# Altium footprint library DCDCv1.1.PcbLib: 114 footprints (part 4 of 8)
Each footprint in its own frame and in the unit in brackets; x right, y up, seen from the top. Pads: shape width x height; smd on the part's side, far side on the other; paste and mask are expansions set on the pad; w line width, h text height; cw(c..) or ccw(c..) is an arc to the next point about the centre after c.
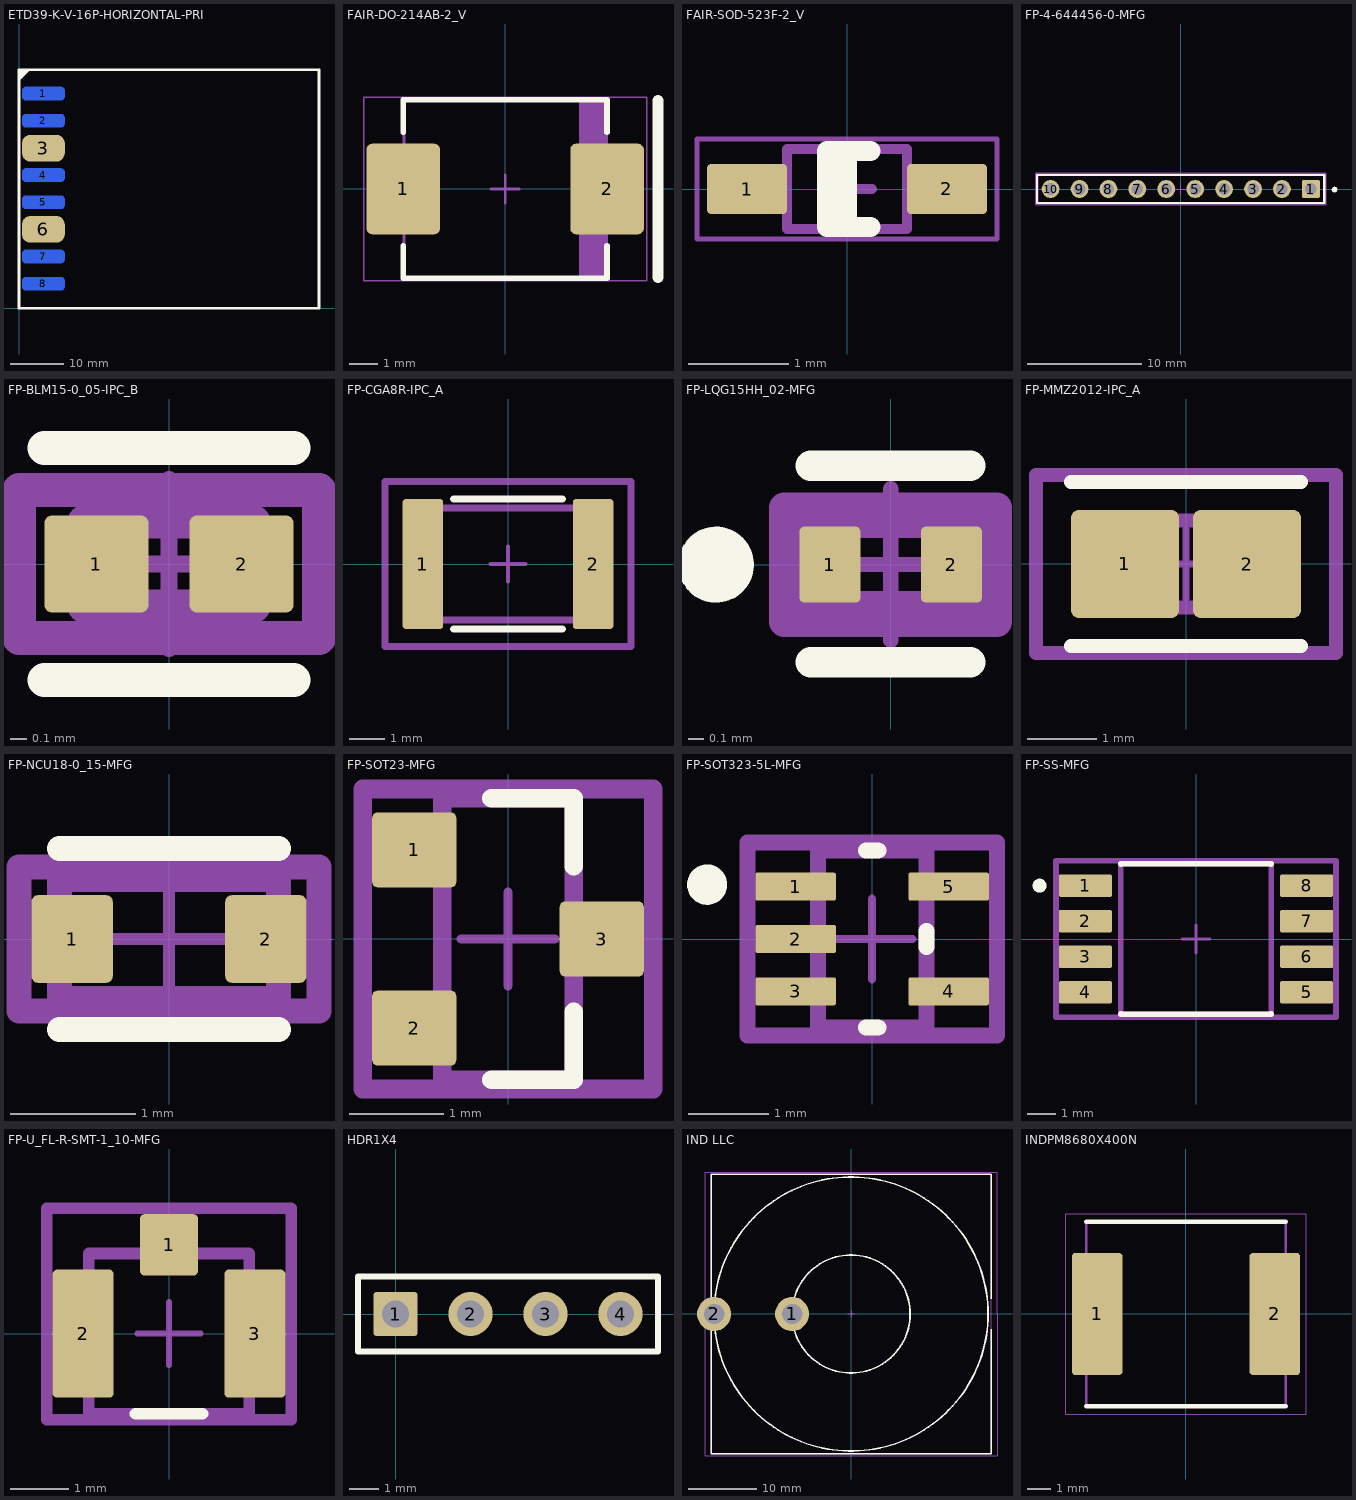
[diagram p3: the footprints below, top view; thin cyan lines are the x and y axes]

## ETD39-K-V-16P-HORIZONTAL-PRI [mm]
pads (8):
  rrect60% 8x2.5 smd far side: 1(4.564,40.132) 2(4.564,35.052) 4(4.564,24.892) 5(4.564,19.812) 7(4.564,9.652) 8(4.564,4.572)
  rrect60% 8x5 smd: 3(4.564,29.925) 6(4.564,14.732)
Top Overlay:
  region: 0.127,42.672 1.905,44.45 0.127,44.45 0,44.577
  lines w0.5: 0,0 0,44.577 56.134,44.577 56.134,0 0,0
3D body "ETD39-K-V-16P.STEP": height 0.5, standoff -28.5, extent 3.225,0.125 55.425,44.625

## FAIR-DO-214AB-2_V [mm]
pads (2):
  rrect15% 2.6x3.2 smd: 1(-3.6,0) 2(3.6,0)
Top Overlay:
  lines w0.2: -3.6,-2 -3.6,-3.15 3.6,-3.15 3.6,-2 ; -3.6,2 -3.6,3.15 3.6,3.15 3.6,2
  lines w0.4: 5.4,-3.125 5.4,3.125
Mechanical 13:
  rectangle: 2.613,-3.125 3.575,3.125
  lines w0.1: -3.575,-3.125 3.575,-3.125 3.575,3.125 -3.575,3.125 -3.575,-3.125
Mechanical 15:
  lines w0.05: -5,-3.25 5,-3.25 5,3.25 -5,3.25 -5,-3.25
  lines w0.1: -0.5,0 0.5,0 ; 0,-0.5 0,0.5
3D body "DIOM6959X26L.step": height 2.65, standoff 0, extent -3.795,-3.125 3.795,3.125

## FAIR-SOD-523F-2_V [mm]
pads (2):
  rrect15% 0.8x0.5 smd: 1(-1,0) 2(1,0)
Top Overlay:
  lines w0.2: 0,-0.381 0,0.381 ; 0.236,-0.381 -0.2,-0.381 -0.2,0.381 0.236,0.381
Mechanical 13:
  lines w0.1: -0.6,-0.4 -0.6,0.4 0.6,0.4 0.6,-0.4 -0.6,-0.4
Mechanical 15:
  lines w0.05: -1.5,-0.5 -1.5,0.5 1.5,0.5 1.5,-0.5 -1.5,-0.5
  lines w0.1: -0.25,0 0.25,0 ; 0,-0.25 0,0.25
3D body: height 0.71, standoff 0.01, extent -0.6,-0.4 0.6,0.4

## FP-4-644456-0-MFG [mil]
pads (10):
  rrect15% 61.65x61.65 hole 40 paste-39370.1 mask+0: 1(450,0)
  round 61.65 hole 40 paste-39370.1 mask+0: 2(350,0) 3(250,0) 4(150,0) 5(50,0) 6(-50,0) 7(-150,0) 8(-250,0) 9(-350,0) 10(-450,0)
Top Overlay:
  circle w9.84: c531.95,-1.97 r4.92
  lines w7.87: -496.59,-48.5 496.59,-48.5 496.59,48.5 -496.59,48.5 -496.59,-48.5
Top 3D Body:
  lines w7.87: -496.5,-48.5 496.5,-48.5 496.5,48.5 -496.5,48.5 -496.5,-48.5
Top Courtyard:
  lines w7.87: -500.44,-52.44 500.44,-52.44 500.44,52.44 -500.44,52.44 -500.44,-52.44
Top Assembly:
  lines w7.87: -500.44,-52.44 500.44,-52.44 500.44,52.44 -500.44,52.44 -500.44,-52.44
  text ".Designator" at 0,7.4 h39.37
Top Component Center:
  lines w3.94: -19.68,0 19.68,0 ; 0,-19.68 0,19.68
3D body "Conn_TE_Connectivity_4-644456-0_eec.STEP": height 10, standoff 0, extent -500.44,-52.44 500.44,52.44

## FP-BLM15-0_05-IPC_B [mm]
pads (2):
  rrect15% 0.615x0.572 smd paste+0 mask+0: 1(-0.429,0) 2(0.429,0)
Top Overlay:
  lines w0.2: -0.736,-0.686 0.736,-0.686 ; -0.736,0.686 0.736,0.686
Top 3D Body:
  lines w0.2: -0.5,-0.25 -0.5,0.25 0.5,0.25 0.5,-0.25 -0.5,-0.25
Top Courtyard:
  lines w0.2: -0.886,-0.436 -0.886,0.436 0.886,0.436 0.886,-0.436 -0.886,-0.436
Top Assembly:
  lines w0.2: -0.886,-0.436 -0.886,0.436 0.886,0.436 0.886,-0.436 -0.886,-0.436
  text ".Designator" at 0,0.188 h1
Top Component Center:
  lines w0.1: -0.5,0 0.5,0 ; 0,-0.5 0,0.5
3D body "FBead_Murata_BLM15PX471SN1B_eec.STEP": height 0.25, standoff 0, extent -0.886,-0.436 0.886,0.436

## FP-CGA8R-IPC_A [mm]
pads (2):
  rrect15% 1.153x3.703 smd paste+0 mask+0: 1(-2.425,0) 2(2.425,0)
Top Overlay:
  lines w0.2: -1.548,-1.852 1.548,-1.852 ; -1.548,1.852 1.548,1.852
Top 3D Body:
  lines w0.2: -2.25,-1.6 2.25,-1.6 2.25,1.6 -2.25,1.6 -2.25,-1.6
Top Courtyard:
  lines w0.2: -3.502,-2.352 3.502,-2.352 3.502,2.352 -3.502,2.352 -3.502,-2.352
Top Assembly:
  lines w0.2: -3.502,-2.352 3.502,-2.352 3.502,2.352 -3.502,2.352 -3.502,-2.352
  text ".Designator" at 0,0.188 h1
Top Component Center:
  lines w0.1: -0.5,0 0.5,0 ; 0,-0.5 0,0.5
3D body "Cap_TDK_CGA8L1X7S3A103M160KA_eec.STEP": height 0.25, standoff 0, extent -3.502,-2.352 3.502,2.352

## FP-LQG15HH_02-MFG [mm]
pads (2):
  rrect15% 0.4x0.5 smd paste+0 mask+0: 1(-0.4,0) 2(0.4,0)
Top Overlay:
  circle w0.25: c-1.15,0 r0.125
  lines w0.2: -0.525,-0.642 0.525,-0.642 ; -0.525,0.65 0.525,0.65
Top 3D Body:
  lines w0.2: -0.525,-0.275 -0.525,0.275 0.525,0.275 0.525,-0.275 -0.525,-0.275
Top Courtyard:
  lines w0.2: -0.7,-0.375 -0.7,0.375 0.7,0.375 0.7,-0.375 -0.7,-0.375
Top Assembly:
  lines w0.2: -0.7,-0.375 -0.7,0.375 0.7,0.375 0.7,-0.375 -0.7,-0.375
  text ".Designator" at 0,0 h1
Top Component Center:
  lines w0.1: -0.5,0 0.5,0 ; 0,-0.5 0,0.5
3D body "Ind_Murata_LQG15HN39NJ02D_eec.STEP": height 0.55, standoff 0, extent -0.5,-0.25 0.5,0.25

## FP-MMZ2012-IPC_A [mm]
pads (2):
  rrect15% 1.554x1.556 smd paste+0 mask+0: 1(-0.876,0) 2(0.876,0)
Top Overlay:
  lines w0.2: -1.653,-1.178 1.653,-1.178 ; -1.653,1.178 1.653,1.178
Top 3D Body:
  lines w0.2: -1,-0.625 -1,0.625 1,0.625 1,-0.625 -1,-0.625
Top Courtyard:
  lines w0.2: -2.153,-1.278 -2.153,1.278 2.153,1.278 2.153,-1.278 -2.153,-1.278
Top Assembly:
  lines w0.2: -2.153,-1.278 -2.153,1.278 2.153,1.278 2.153,-1.278 -2.153,-1.278
  text ".Designator" at 0,0.188 h1
Top Component Center:
  lines w0.1: -0.5,0 0.5,0 ; 0,-0.5 0,0.5
3D body "FBead_TDK_MMZ2012R102AT000_eec.STEP": height 0.25, standoff 0, extent -2.153,-1.278 2.153,1.278

## FP-NCU18-0_15-MFG [mm]
pads (2):
  rrect15% 0.65x0.7 smd paste+0 mask+0: 1(-0.775,0) 2(0.775,0)
Top Overlay:
  lines w0.2: -0.875,-0.725 0.875,-0.725 ; -0.875,0.725 0.875,0.725
Top 3D Body:
  lines w0.2: -0.875,-0.475 0.875,-0.475 0.875,0.475 -0.875,0.475 -0.875,-0.475
Top Courtyard:
  lines w0.2: -1.2,-0.575 1.2,-0.575 1.2,0.575 -1.2,0.575 -1.2,-0.575
Top Assembly:
  lines w0.2: -1.2,-0.575 1.2,-0.575 1.2,0.575 -1.2,0.575 -1.2,-0.575
  text ".Designator" at 0,0.188 h1
Top Component Center:
  lines w0.1: -0.5,0 0.5,0 ; 0,-0.5 0,0.5
3D body "Res_Murata_NCU18WB473J6SRB_eec.STEP": height 0.95, standoff 0, extent -0.8,-0.4 0.8,0.4

## FP-SOT23-MFG [mm]
pads (3):
  rrect15% 0.9x0.8 smd paste+0 mask+0: 1(-1,0.95) 2(-1,-0.95) 3(1,0)
Top Overlay:
  lines w0.2: -0.175,-1.5 0.7,-1.5 0.7,-0.775 ; -0.175,1.5 0.7,1.5 0.7,0.775
Top 3D Body:
  lines w0.2: -0.7,-1.5 0.7,-1.5 0.7,1.5 -0.7,1.5 -0.7,-1.5
Top Courtyard:
  lines w0.2: -1.55,-1.6 1.55,-1.6 1.55,1.6 -1.55,1.6 -1.55,-1.6
Top Assembly:
  lines w0.2: -1.55,-1.6 1.55,-1.6 1.55,1.6 -1.55,1.6 -1.55,-1.6
  text ".Designator" at 0,0 h1
Top Component Center:
  lines w0.1: -0.5,0 0.5,0 ; 0,-0.5 0,0.5
3D body "Diode_Diodes_Inc_BZX84C18-7-F_eec.STEP": height 1.1, standoff 0, extent -1.2,-1.45 1.2,1.45

## FP-SOT323-5L-MFG [mm]
pads (5):
  rrect15% 1x0.35 smd paste+0 mask+0: 1(-0.95,0.65) 2(-0.95,0) 3(-0.95,-0.65) 4(0.95,-0.65) 5(0.95,0.65)
Top Overlay:
  circle w0.25: c-2.05,0.675 r0.125
  lines w0.2: -0.075,-1.1 0.075,-1.1 ; -0.075,1.1 0.075,1.1 ; 0.675,-0.1 0.675,0.1
Top 3D Body:
  lines w0.2: -0.675,-1.1 0.675,-1.1 0.675,1.1 -0.675,1.1 -0.675,-1.1
Top Courtyard:
  lines w0.2: -1.55,-1.2 1.55,-1.2 1.55,1.2 -1.55,1.2 -1.55,-1.2
Top Assembly:
  lines w0.2: -1.55,-1.2 1.55,-1.2 1.55,1.2 -1.55,1.2 -1.55,-1.2
  text ".Designator" at 0,0 h1
Top Component Center:
  lines w0.1: -0.5,0 0.5,0 ; 0,-0.5 0,0.5
3D body "Diode_STMicroelectronics_ESDA6V1W5_eec.STEP": height 0.25, standoff 0, extent -1.55,-1.2 1.55,1.2

## FP-SS-MFG [mm]
pads (8):
  rrect15% 1.9x0.8 smd paste-1000 mask+0: 1(-3.95,1.905) 2(-3.95,0.635) 3(-3.95,-0.635) 4(-3.95,-1.905) 5(3.95,-1.905) 6(3.95,-0.635) 7(3.95,0.635) 8(3.95,1.905)
Top Overlay:
  circle w0.25: c-5.59,1.905 r0.125
  lines w0.2: -2.69,-2.68 -2.69,-2.69 2.69,-2.69 2.69,-2.68 ; -2.69,2.68 -2.69,2.69 2.69,2.69 2.69,2.68
Top Paste:
  rectangle: 3.05,-2.255 4.85,-1.555
  rectangle: 3.05,-0.985 4.85,-0.285
  rectangle: 3.05,0.285 4.85,0.985
  rectangle: 3.05,1.555 4.85,2.255
  rectangle: -4.85,-2.255 -3.05,-1.555
  rectangle: -4.85,-0.985 -3.05,-0.285
  rectangle: -4.85,0.285 -3.05,0.985
  rectangle: -4.85,1.555 -3.05,2.255
Top 3D Body:
  lines w0.2: -2.69,-2.69 2.69,-2.69 2.69,2.69 -2.69,2.69 -2.69,-2.69
Top Courtyard:
  lines w0.2: -5,-2.79 5,-2.79 5,2.79 -5,2.79 -5,-2.79
Top Assembly:
  lines w0.2: -5,-2.79 5,-2.79 5,2.79 -5,2.79 -5,-2.79
  text ".Designator" at 0,0.188 h1
Top Component Center:
  lines w0.1: -0.5,0 0.5,0 ; 0,-0.5 0,0.5
3D body "IC_Winbond_W25Q32FVSSIG_eec.STEP": height 2.16, standoff 0, extent -3.964,-2.64 3.964,2.64

## FP-U_FL-R-SMT-1_10-MFG [mm]
pads (3):
  rrect15% 1x1.05 smd paste-1000 mask+0: 1(0,1.525)
  rrect15% 1.05x2.2 smd paste-1000 mask+0: 2(-1.475,0) 3(1.475,0)
Top Overlay:
  lines w0.2: -0.575,-1.375 0.575,-1.375
Top Paste:
  rectangle: -1.95,-1 -1.05,1
  rectangle: 1.05,-1 1.95,1
  rectangle: -0.4,1.1 0.4,1.95
Top 3D Body:
  lines w0.2: -1.375,-1.375 1.375,-1.375 1.375,1.375 -1.375,1.375 -1.375,-1.375
Top Courtyard:
  lines w0.2: -2.1,-1.475 2.1,-1.475 2.1,2.15 -2.1,2.15 -2.1,-1.475
Top Assembly:
  lines w0.2: -2.1,-1.475 2.1,-1.475 2.1,2.15 -2.1,2.15 -2.1,-1.475
  text ".Designator" at 0,0.526 h1
Top Component Center:
  lines w0.1: -0.544,0 0.544,0 ; 0,-0.544 0,0.544
3D body "Conn_HIROSE_U_FL-R-SMT-1_10_eec.STEP": height 1.45, standoff 0, extent -1.5,-1.55 1.5,1.55

## HDR1X4 [mm]
pads (4):
  rrect15% 1.5x1.5 hole 0.9: 1(0,0)
  round 1.5 hole 0.9: 2(2.54,0) 3(5.08,0) 4(7.62,0)
Top Overlay:
  lines w0.2: -1.27,-1.27 8.89,-1.27 8.89,1.27 -1.27,1.27 -1.27,-1.27

## IND LLC [mm]
pads (2):
  round 5 hole 3: 1(-8.636,0) 2(-20.066,0)
Top Overlay:
  circle w0.254: c0,0 r20.066
  circle w0.254: c0,0 r8.644
  lines w0.2: -20.5,-2.2 -20.5,-20.5 20.5,-20.5 20.5,-2.2 ; -20.5,2.2 -20.5,20.5 20.5,20.5 20.5,2.2
Mechanical 13:
  lines w0.1: -20.5,-20.5 20.5,-20.5 20.5,20.5 -20.5,20.5 -20.5,-20.5
Mechanical 15:
  lines w0.05: -21.375,-20.75 21.375,-20.75 21.375,20.75 -21.375,20.75 -21.375,-20.75
  lines w0.1: -0.5,0 0.5,0 ; 0,-0.5 0,0.5
3D body: height 0.25, standoff 0, extent -20.6,-20.5 20.6,20.5

## INDPM8680X400N [mm]
pads (2):
  rrect15% 2.2x5.3 smd: 1(-3.85,0) 2(3.85,0)
Top Overlay:
  lines w0.2: -4.325,-4 4.325,-4 ; -4.325,4 4.325,4
Mechanical 13:
  lines w0.1: -4.325,-4 -4.325,4 4.325,4 4.325,-4 -4.325,-4
Mechanical 15:
  lines w0.05: -5.2,-4.35 -5.2,4.35 5.2,4.35 5.2,-4.35 -5.2,-4.35
3D body "MPX1D0840L470.stp": height 4, standoff 0, extent -4.325,-4 4.325,4